# Altium footprint library 总库.PcbLib: 264 footprints (part 5 of 17)
Each footprint in its own frame and in the unit in brackets; x right, y up, seen from the top. Pads: shape width x height; smd on the part's side, far side on the other; paste and mask are expansions set on the pad; w line width, h text height; cw(c..) or ccw(c..) is an arc to the next point about the centre after c.
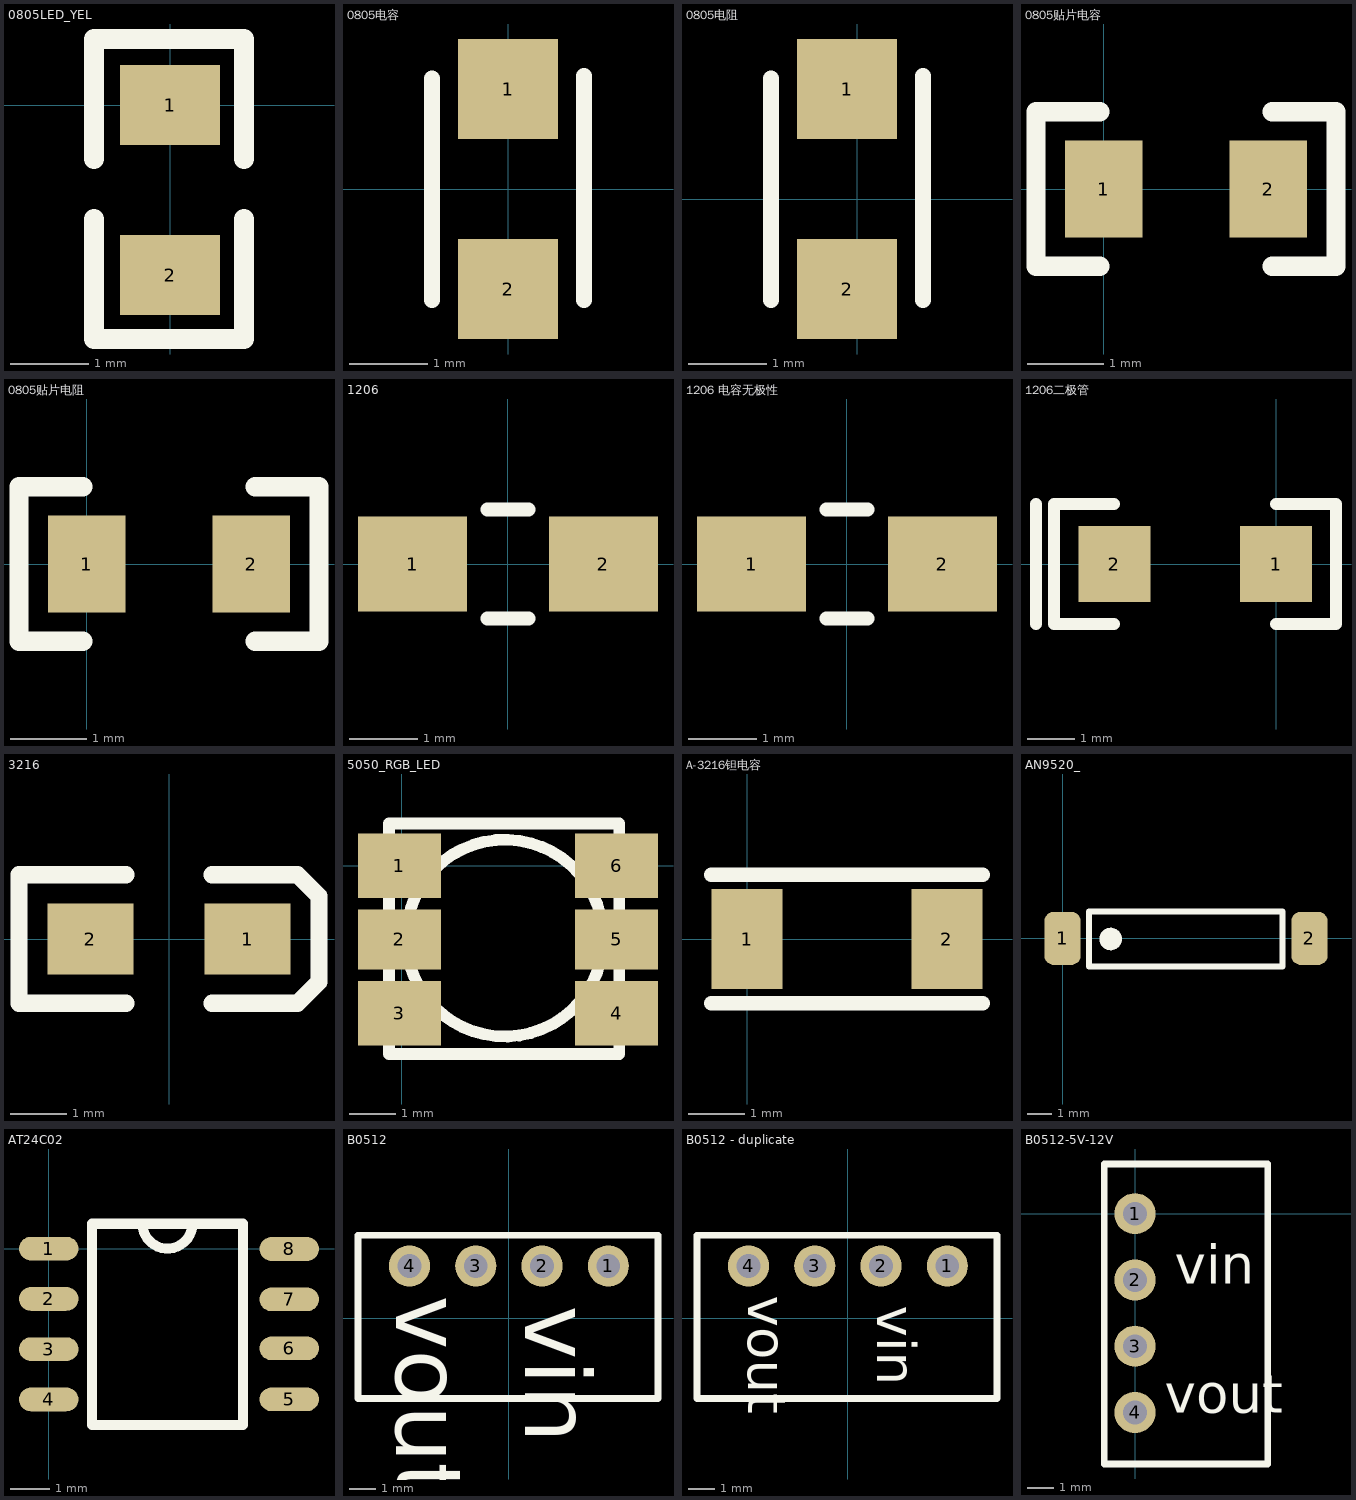
[diagram p4: the footprints below, top view; thin cyan lines are the x and y axes]

## 0805LED_YEL [mil]
pads (2):
  rect 50x40 smd: 1(0,0) 2(0,-85)
Top Overlay:
  lines w10: -38,-57 -38,-117 37,-117 37,-57 ; -38,-27 -38,33 37,33 37,-27
3D body: height 43.31, standoff 0, extent -24.21,-84.76 25,-5.24

## 0805电容 [mm]
pads (2):
  rect 1.27x1.27 smd: 1(0,1.27) 2(0,-1.27)
Top Overlay:
  lines w0.203: -0.965,-1.413 -0.965,1.402 ; 0.965,-1.412 0.965,1.438
3D body: height 0.77, standoff -0.01, extent -0.625,-1 0.625,1

## 0805电阻 [mil]
pads (2):
  rect 50x50 smd: 1(-5,55) 2(-5,-45)
Top Overlay:
  lines w8: -43,-50.61 -43,60.2 ; 33,-50.59 33,61.62
3D body: height 30.39, standoff -0.39, extent -29.61,-34.5 19.61,44.24

## 0805贴片电容 [mil]
pads (2):
  rect 40x50 smd: 1(0,0) 2(85,0)
Top Overlay:
  lines w10: -2,-40 -35,-40 -35,40 -2,40 ; 87,-40 120,-40 120,40 87,40
3D body: height 31.5, standoff 0, extent 18,-25 66,25
3D body: height 30, standoff 0, extent 2,-25 18,25
3D body: height 30, standoff 0, extent 66,-25 82,25

## 0805贴片电阻 [mil]
pads (2):
  rect 40x50 smd: 1(0,0) 2(85,0)
Top Overlay:
  lines w10: -2,-40 -35,-40 -35,40 -2,40 ; 87,-40 120,-40 120,40 87,40
3D body: height 31.5, standoff 0, extent 18,-25 66,25
3D body: height 30, standoff 0, extent 2,-25 18,25
3D body: height 30, standoff 0, extent 66,-25 82,25

## 1206 [mm]
height 1.75
pads (2):
  rect 1.6x1.397 smd: 1(-1.4,0) 2(1.4,0)
Top Overlay:
  lines w0.2: -0.3,-0.8 0.3,-0.8 ; -0.3,0.8 0.3,0.8
3D body: height 1.02, standoff 0, extent -1.651,-0.635 1.651,0.635

## 1206 电容无极性 [mm]
pads (2):
  rect 1.6x1.397 smd: 1(-1.4,0) 2(1.4,0)
Top Overlay:
  lines w0.2: -0.3,-0.8 0.3,-0.8 ; -0.3,0.8 0.3,0.8
3D body: height 1.02, standoff 0, extent -1.651,-0.635 1.651,0.635

## 1206二极管 [mm]
pads (2):
  rect 1.52x1.6 smd: 1(0,0) 2(-3.42,0)
Top Overlay:
  lines w0.254: -5.08,-1.27 -5.08,1.27 ; -3.429,-1.27 -4.699,-1.27 -4.699,1.27 -3.429,1.27 ; 0,-1.27 1.27,-1.27 1.27,1.27 0,1.27

## 3216 [mil]
pads (2):
  rect 60x50 smd: 1(55,0) 2(-55,0)
Top Overlay:
  lines w12: -30,-45 -105,-45 -105,45 -30,45 ; 30,-45 90,-45 105,-30 105,30 90,45 30,45
3D body: height 62.99, standoff 0, extent -62.98,-31.5 63,31.5

## 5050_RGB_LED [mm]
pads (6):
  rect 1.8x1.4 smd: 1(-0.051,0) 3(-0.051,-3.203) 4(4.663,-3.203) 6(4.663,0)
  rect 1.8x1.3 smd: 2(-0.051,-1.601) 5(4.663,-1.601)
Top Overlay:
  circle w0.254: c2.235,-1.575 r2.137
  lines w0.254: -0.279,-4.089 4.721,-4.089 ; -0.279,-4.086 -0.279,0.914 4.721,0.914 ; 4.724,-4.089 4.724,0.911
3D body: height 0.9, standoff 0, extent 0.089,-3.721 4.382,0.572
3D body: height 0.8, standoff 0, extent -0.406,-4.216 4.851,1.041

## A-3216钽电容 [mm]
pads (2):
  rect 1.27x1.78 smd: 1(0,0) 2(3.556,0)
Top Overlay:
  lines w0.254: -0.635,-1.143 4.191,-1.143 ; -0.635,1.143 4.191,1.143

## AN9520_ [mm]
pads (2):
  rrect50% 1.5x2.2 smd: 1(0,0) 2(10.24,0)
Top Overlay:
  circle w0.254: c1.995,-0.025 r0.342
  rectangle: 1.727,-0.279 2.311,0.279
  lines w0.254: 1.092,-1.168 1.092,1.118 9.119,1.118 9.119,-1.168 1.092,-1.168

## AT24C02 [mm]
pads (8):
  oval 1.5x0.6 smd: 1(0,0) 2(0,-1.27) 3(0,-2.54) 4(0,-3.81) 5(6.08,-3.805) 6(6.08,-2.517) 7(6.08,-1.28) 8(6.08,-0.008)
Top Overlay:
  lines w0.254: 2.37,0.63 ccw(c3,0.63) 3.63,0.63 ; 1.095,-4.45 1.095,0.63 4.905,0.63 4.905,-4.45 1.095,-4.45

## B0512 [mil]
pads (4):
  round 62 hole 36: 1(150,79) 2(50,79) 3(-50,79) 4(-150,79)
Top Overlay:
  lines w10: -227.76,-121 -227.76,125.22 225,125.22 225,-121 -227.76,-121
  text "vin" at 25,19 h100
  text "vout" at -170,34 h100
3D body: height 393.7, standoff 0, extent -232.76,-126 230,130.22

## B0512 - duplicate [mil]
pads (4):
  round 62 hole 36: 1(150,79) 2(50,79) 3(-50,79) 4(-150,79)
Top Overlay:
  lines w10: -227.76,-121 225,-121 225,125.22 -227.76,125.22 -227.76,-121
  text "vout" at -170,34 h100
  text "vin" at 25,19 h100
3D body: height 393.7, standoff 0, extent -232.76,-126 230,130.22

## B0512-5V-12V [mil]
pads (4):
  round 62 hole 36: 1(0,0) 2(0,-100) 3(0,-200) 4(0,-300)
Top Overlay:
  lines w10: -46.22,-377.76 -46.22,75 200,75 200,-377.76 -46.22,-377.76
  text "vout" at 45,-320 h100
  text "vin" at 60,-125 h100
3D body: height 393.7, standoff 0, extent -51.22,-382.76 205,80